# Altium footprint library PCBLIB.PcbLib: 775 footprints (part 41 of 49)
Each footprint in its own frame and in the unit in brackets; x right, y up, seen from the top. Pads: shape width x height; smd on the part's side, far side on the other; paste and mask are expansions set on the pad; w line width, h text height; cw(c..) or ccw(c..) is an arc to the next point about the centre after c.
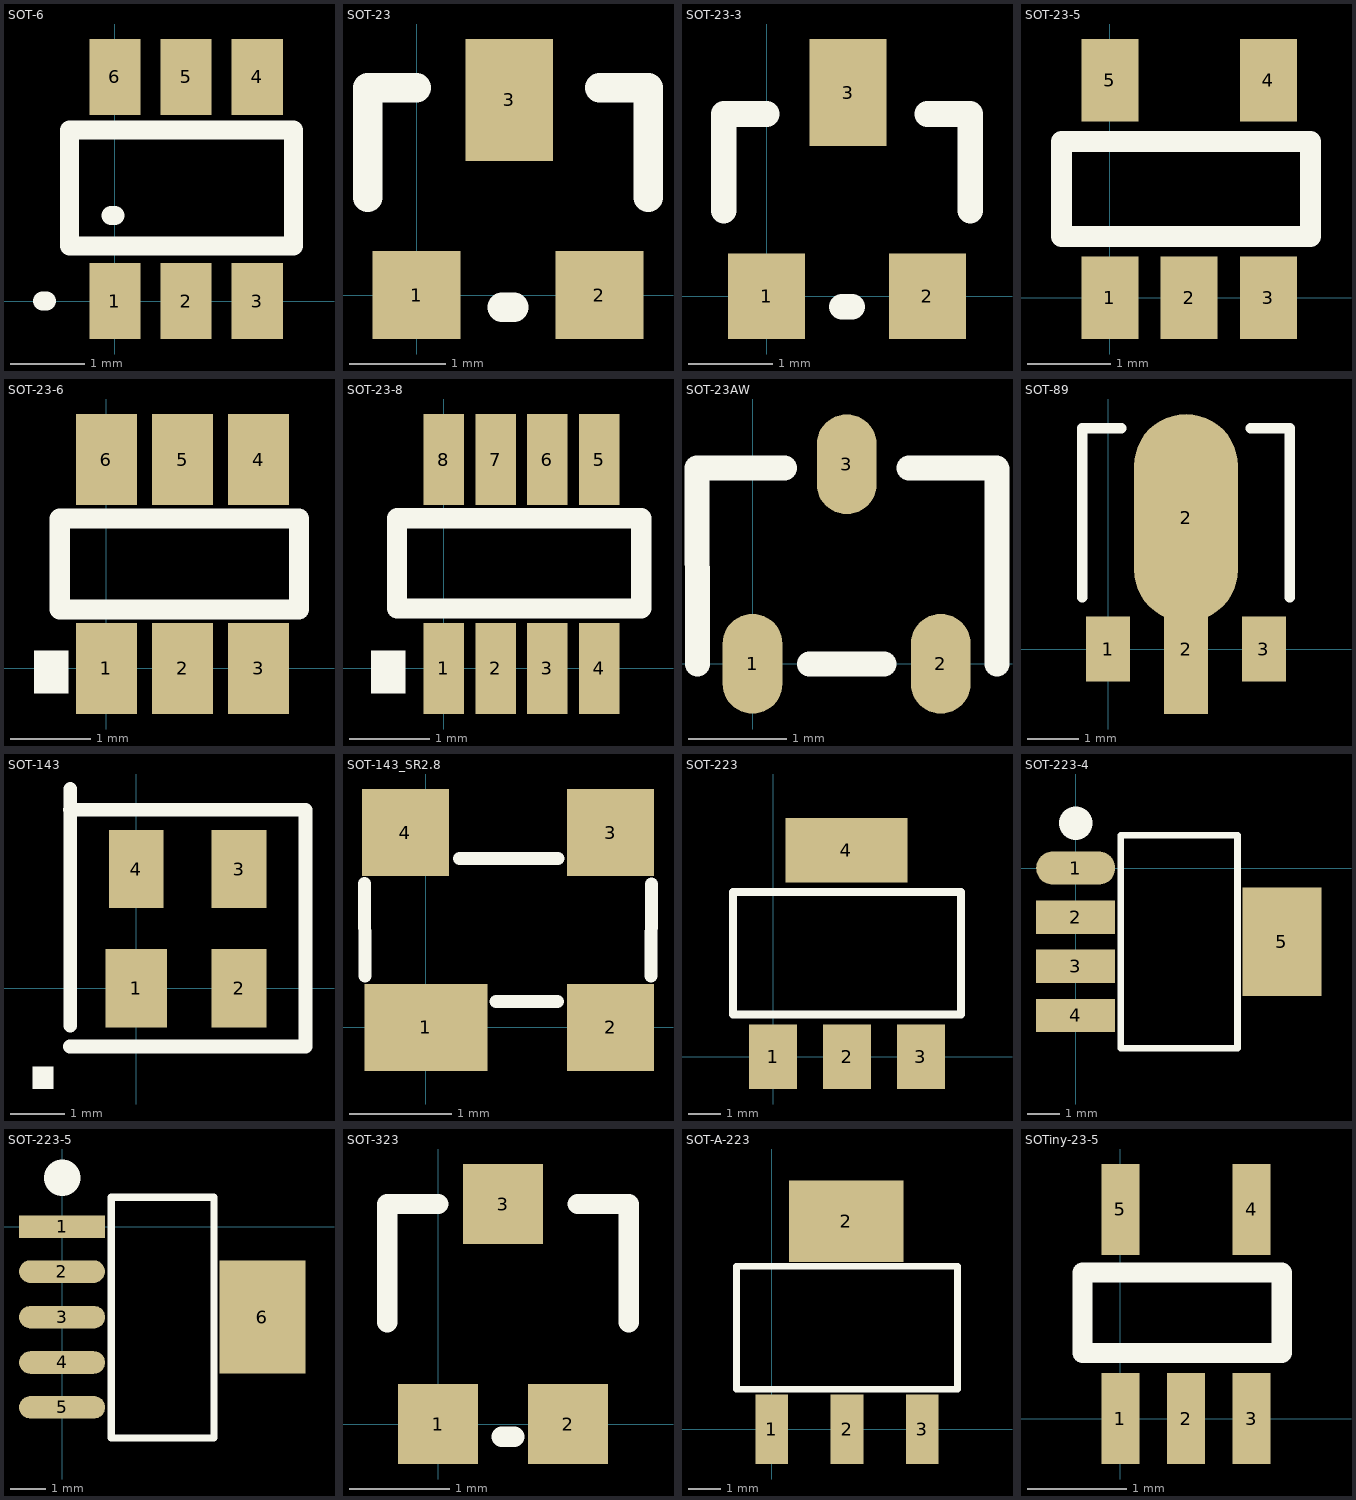
[diagram p40: the footprints below, top view; thin cyan lines are the x and y axes]

## SOT-6 [mil]
pads (6):
  rect 27x40 smd: 1(0,0) 2(37.5,0) 3(75,0) 4(75,118) 5(37.5,118) 6(0,118)
TopOverlay:
  lines w10: -38,0 -36,0 ; -2,45 0,45 ; -24,29 -24,90 94,90 94,29 -24,29
Mechanical4:
  text ".047" at 0,0 h1

## SOT-23 [mil]
height 50
pads (3):
  rect 36x36 smd: 1(0,0) 2(75,0)
  rect 36x50 smd: 3(38,80)
TopOverlay:
  lines w12: -20,40 -20,85 0,85 ; 35,-5 40,-5 ; 75,85 95,85 95,40
Mechanical4:
  text ".040" at 0,0 h1

## SOT-23-3 [mil]
height 40
pads (3):
  rect 36x40 smd: 1(0,0) 2(75,0)
  rect 36x50 smd: 3(38,95)
TopOverlay:
  lines w12: -20,40 -20,85 0,85 ; 35,-5 40,-5 ; 75,85 95,85 95,40
Mechanical4:
  text ".040" at 0,0 h1

## SOT-23-5 [mil]
height 120
pads (5):
  rect 27x39 smd: 1(0,0) 2(37.5,0) 3(75,0) 4(75,103) 5(0,103)
TopOverlay:
  lines w10: -23,29 -23,74 95,74 95,29 -23,29
Mechanical4:
  text ".044" at 0,0 h1

## SOT-23-6 [mil]
height 120
pads (6):
  rect 30x45 smd: 1(0,0) 2(37.5,0) 3(75,0) 4(75,103) 5(37.5,103) 6(0,103)
TopOverlay:
  rectangle: -35.83,-12.48 -18.82,8.9
  lines w10: -23,29 -23,74 95,74 95,29 -23,29
Mechanical4:
  text ".044" at 0,0 h1

## SOT-23-8 [mil]
height 120
pads (8):
  rect 20x45 smd: 1(0,0) 2(25.59,0) 3(51.18,0) 4(76.77,0) 5(76.77,102.99) 6(51.18,102.99) 7(25.59,102.99) 8(0,102.99)
TopOverlay:
  rectangle: -35.83,-12.48 -18.82,8.9
  lines w10: -23,29.57 -23,74 97.4,74 97.4,29.57 -23,29.57
Mechanical4:
  text ".044" at 0,0 h1

## SOT-23AW [mil]
height 50
pads (3):
  oval 24x40 smd: 1(0,0) 2(75.44,0) 3(37.75,80)
TopOverlay:
  lines w10: -22,0 -22.25,78.5 12.75,78.5 ; 22.75,0 52.75,0 ; 62.75,78.5 97.75,78.5 ; 98,0 98,78

## SOT-89 [mil]
pads (4):
  rect 34x50 smd: 1(0,0) 3(120,0)
  rect 34x100 smd: 2(60,0)
  oval 80x160 smd: 2(60,101)
TopOverlay:
  lines w8: -20,40 -20,170 10,170 ; 110,170 140,170 140,40
Mechanical4:
  text ".050" at 0,0 h1

## SOT-143 [mil]
pads (4):
  rect 45x57 smd: 1(0,0)
  rect 40x57 smd: 2(75,0) 3(75,87) 4(0,87)
TopOverlay:
  rectangle: -75.62,-73.47 -60.3,-56.95
  lines w10: -48.39,-42.53 123.46,-42.53 ; -48.39,130.22 123.46,130.22 123.46,-42.53 ; -48.22,-27.33 -48.22,145.42 ; 123.46,-36.22 123.46,-42.53

## SOT-143_SR2.8 [mm]
height 1.14
pads (4):
  rect 1.2x0.85 smd: 1(0,0)
  rect 0.85x0.85 smd: 2(1.8,0) 3(1.8,1.9) 4(-0.2,1.9)
TopOverlay:
  lines w0.127: -0.597,1.404 -0.596,0.503 ; 0.326,1.648 1.287,1.648 ; 0.684,0.251 1.284,0.251 ; 2.195,0.503 2.197,1.401
  text "." at -0.648,-1.101 h5.08

## SOT-223 [mil]
pads (4):
  rect 59x79 smd: 1(0,0) 2(90.55,0) 3(181.1,0)
  rect 150x79 smd: 4(89.88,253.54)
TopOverlay:
  lines w10: -49.45,52 -49.45,202 230.55,202 230.55,52 -49.45,52
Mechanical4:
  text ".060" at 0,0 h1
  text ".065" at 0.1,0 h1

## SOT-223-4 [mil]
height 71
pads (5):
  oval 95x40 smd: 1(0,0)
  rect 95x40 smd: 2(-0.16,-59.05) 3(0,-118.11) 4(0,-177.16)
  rect 95x130 smd: 5(247.87,-88.58)
TopOverlay:
  lines w8: 54.39,-216.54 194.55,-216.54 194.55,39.37 54.39,39.37 54.39,-216.54
  lines w40: 0.09,53.69 0.09,54.09

## SOT-223-5 [mil]
height 71
pads (6):
  rect 95x25 smd: 1(-0.09,-0.09)
  oval 95x25 smd: 2(-0.25,-49.75) 3(-0.09,-100.17) 4(-0.09,-150.21) 5(-0.09,-199.78)
  rect 95x125 smd: 6(221.33,-100.12)
TopOverlay:
  lines w8: 54.31,-233.6 167.66,-233.6 167.66,32.4 54.31,32.4 54.31,-233.6
  lines w40: 0,53.6 0,54

## SOT-323 [mm]
pads (3):
  rect 0.8x0.8 smd: 1(0,0) 2(1.3,0) 3(0.65,2.2)
TopOverlay:
  lines w0.203: -0.508,1.016 -0.508,2.2 0,2.2 ; 0.635,-0.127 0.762,-0.127 ; 1.397,2.2 1.905,2.2 1.905,1.016
Mechanical4:
  text ".040" at 0,0 h0.03

## SOT-A-223 [mil]
pads (4):
  rect 40x85 smd: 1(0,0) 2(92,0) 3(184,0)
  rect 140x100 smd: 2(91,254)
TopOverlay:
  lines w8: -43,49 227,49 227,199 -43,199 -43,49
Mechanical4:
  text ".050" at 0,0 h1

## SOTiny-23-5 [mil]
pads (5):
  rect 15x36 smd: 1(0,0) 2(26,0) 3(52,0) 4(52,83) 5(0,83)
TopOverlay:
  lines w8: 64,57 64,26 -15,26 -15,58 64,58